# Altium footprint library d1_PcbLib.PcbLib: 266 footprints (part 5 of 17)
Each footprint in its own frame and in the unit in brackets; x right, y up, seen from the top. Pads: shape width x height; smd on the part's side, far side on the other; paste and mask are expansions set on the pad; w line width, h text height; cw(c..) or ccw(c..) is an arc to the next point about the centre after c.
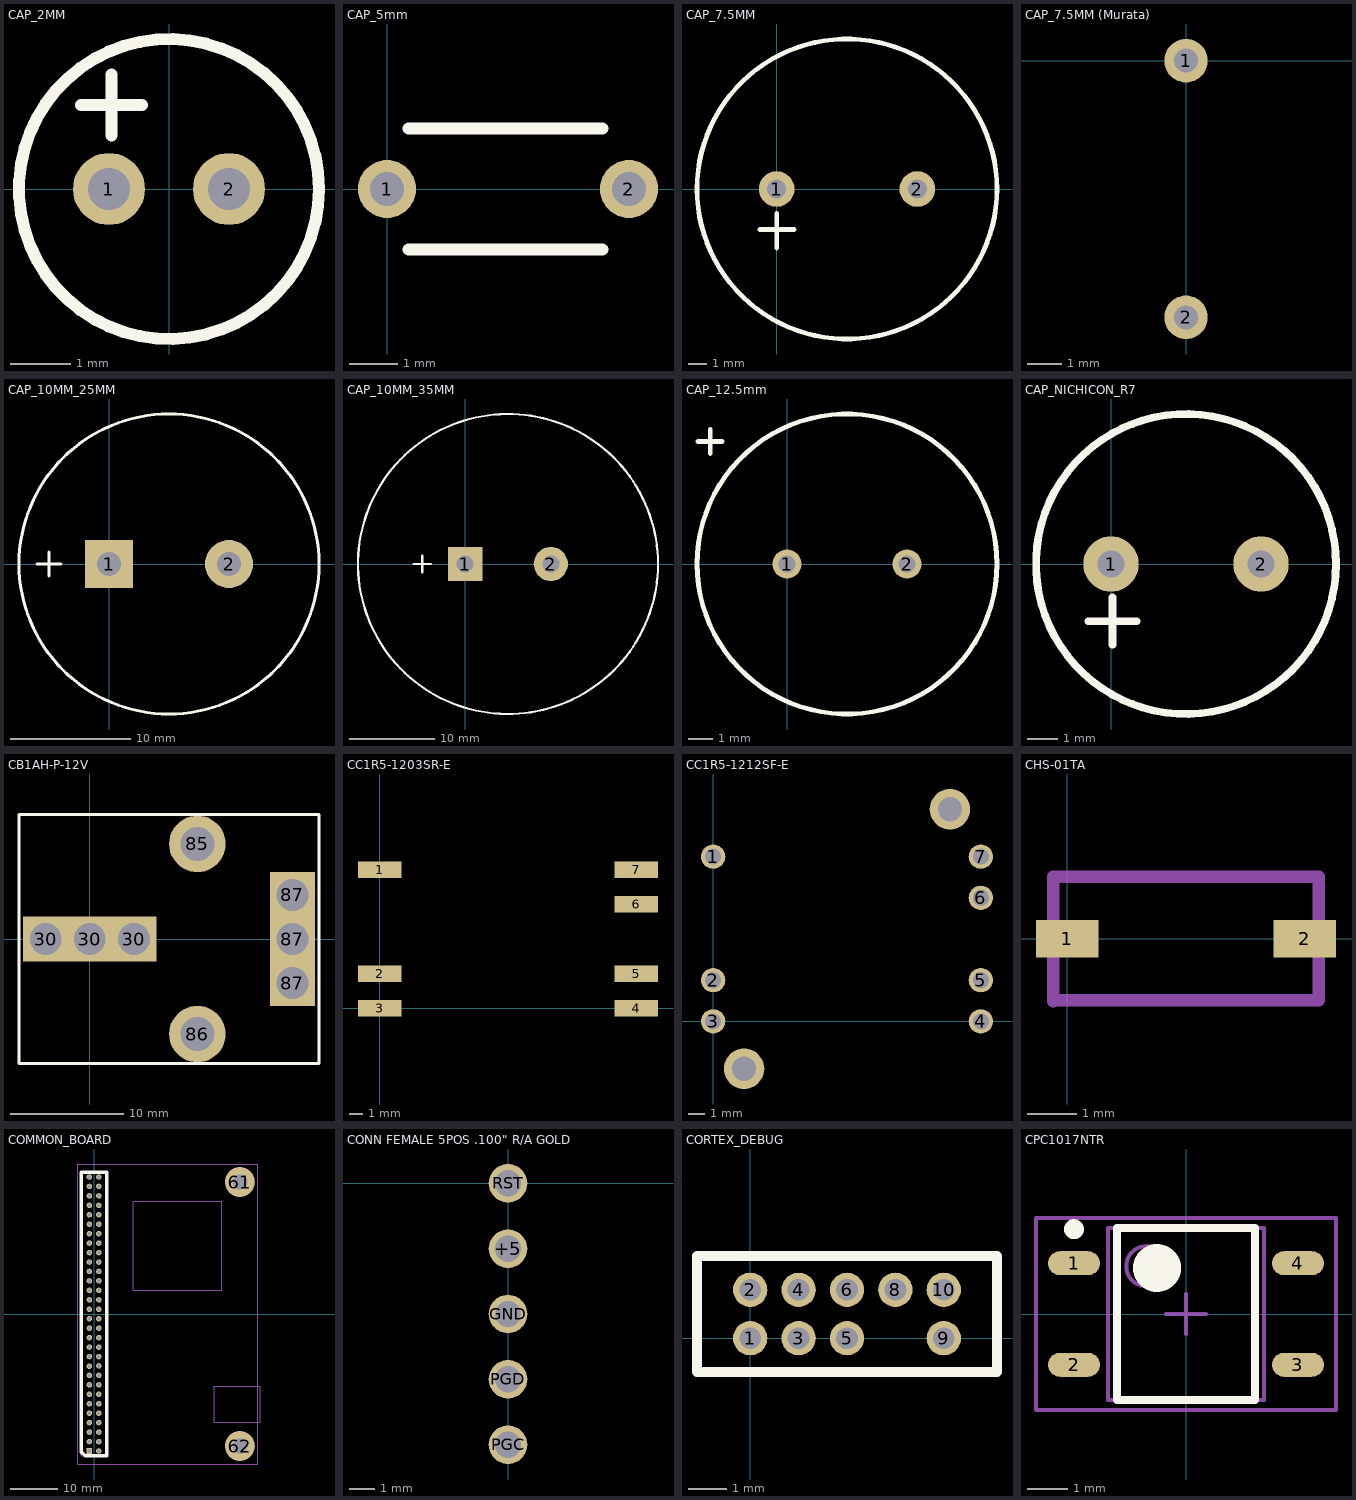
[diagram p4: the footprints below, top view; thin cyan lines are the x and y axes]

## CAP_2MM [mm]
pads (2):
  round 1.2 hole 0.7: 1(-1,0) 2(1,0)
Top Overlay:
  circle w0.2: c0,0 r2.5
  lines w0.2: -1.468,1.4 -0.452,1.4 ; -0.96,0.892 -0.96,1.908
3D body: height 11, standoff -19, extent -2.5,-2.5 2.5,2.5

## CAP_5mm [mm]
pads (2):
  round 1.2 hole 0.7: 1(0,0) 2(5,0)
Top Overlay:
  lines w0.254: 0.45,-1.25 4.45,-1.25 ; 0.45,1.25 4.45,1.25

## CAP_7.5MM [mil]
pads (2):
  round 75 hole 40: 1(0,0) 2(295.28,0)
Top Overlay:
  circle w10: c147.64,0 r314.96
  lines w10: -35,-85 37,-85 ; 0,-124 0,-51

## CAP_7.5MM (Murata) [mm]
pads (2):
  round 1.27 hole 0.7: 1(0,0) 2(0,-7.5)

## CAP_10MM_25MM [mm]
pads (2):
  rect 4x4 hole 2: 1(0,0)
  round 4 hole 2: 2(10,0)
Top Overlay:
  circle w0.254: c5,0 r12.5
  lines w0.254: -6,0 -4,0 ; -5,-1 -5,1
3D body: height 25, standoff 0, extent -7.39,-12.669 17.511,12.282

## CAP_10MM_35MM [mm]
pads (2):
  rect 4x4 hole 2: 1(0,0)
  round 4 hole 2: 2(10,0)
Top Overlay:
  circle w0.254: c5,0 r17.5
  lines w0.254: -6,0 -4,0 ; -5,-1 -5,1
3D body: height 25, standoff 0, extent -12.351,-17.659 22.511,17.272

## CAP_12.5mm [mm]
pads (2):
  round 1.2 hole 0.7: 1(0,0) 2(5,0)
Top Overlay:
  circle w0.2: c2.5,0 r6.25
  lines w0.2: -3.718,5.1 -2.702,5.1 ; -3.2,4.6 -3.2,5.616

## CAP_NICHICON_R7 [mm]
pads (2):
  round 1.85 hole 0.9: 1(0,0) 2(5,0)
Top Overlay:
  circle w0.254: c2.5,0 r5
  lines w0.254: -0.762,-1.905 0.864,-1.905 ; 0.051,-2.692 0.051,-1.118
3D body: height 12.5, standoff 0, extent -2.464,-4.953 7.544,5.055

## CB1AH-P-12V [mm] "RELAY AUTO SPST 12VDC 70A PCB"
pads (8):
  rect 4x4 hole 2.81: 30(-3.9,0) 30(0,0) 30(3.9,0) 87(17.9,-3.9) 87(17.9,0) 87(17.9,3.9)
  round 5 hole 3: 85(9.5,8.4) 86(9.5,-8.4)
Top Overlay:
  lines w0.254: -6.258,-11 -6.258,11 20.242,11 20.242,-11 -6.258,-11

## CC1R5-1203SR-E [mm]
pads (7):
  rect 3.2x1.2 smd: 1(0,10.16) 2(0,2.54) 3(0,0) 4(18.8,0) 5(18.8,2.54) 6(18.8,7.62) 7(18.8,10.16)

## CC1R5-1212SF-E [mm]
height 34
pads (9):
  round 1.5 hole 1: 1(0,10.16) 2(0,2.54) 3(0,0) 4(16.51,0) 5(16.51,2.54) 6(16.51,7.62) 7(16.51,10.16)
  round 2.5 hole 1.5: ""(1.905,-2.92) ""(14.605,13.08)

## CHS-01TA [mil]
pads (2):
  rect 50x30 smd: 1(0,0) 2(190,0)
Mechanical 13:
  lines w10: -11.3,-50 -11.3,49.21 201.3,49.21 201.3,-49.21 -10.51,-49.21 -11.3,-50
3D body: height 98.43, standoff 0, extent -11.32,-50.02 201.32,49.23

## COMMON_BOARD [mil]
pads (62):
  rect 46x46 hole 31: 1(-38.74,-1141.73)
  round 46 hole 31: 2(40,-1141.73) 3(-38.74,-1062.99) 4(40,-1062.99) 5(-38.74,-984.25) 6(40,-984.25) 7(-38.74,-905.51) 8(40,-905.51) 9(-38.74,-826.77) 10(40,-826.77) 11(-38.74,-748.03) 12(40,-748.03) 13(-38.74,-669.29) 14(40,-669.29) 15(-38.74,-590.55) 16(40,-590.55) 17(-38.74,-511.81) 18(40,-511.81) 19(-39.37,-435) 20(40,-433.07) 21(-38.74,-354.33) 22(40,-354.33) 23(-38.74,-275.59) 24(40,-275.59) 25(-38.74,-196.85) 26(40,-196.85) 27(-38.74,-118.11) 28(40,-118.11) 29(-38.74,-39.37) 30(40,-39.37) 31(-38.74,39.37) 32(40,39.37) 33(-38.74,118.11) 34(40,118.11) 35(-38.74,196.85) 36(40,196.85) 37(-38.74,275.59) 38(40,275.59) 39(-38.74,354.33) 40(40,354.33) 41(-38.74,433.07) 42(40,433.07) 43(-38.74,511.81) 44(40,511.81) 45(-38.74,590.55) 46(40,590.55) 47(-38.74,669.29) 48(40,669.29) 49(-38.74,748.03) 50(40,748.03) 51(-38.74,826.77) 52(40,826.77) 53(-38.74,905.51) 54(40,905.51) 55(-38.74,984.25) 56(40,984.25) 57(-38.74,1062.99) 58(40,1062.99) 59(-38.74,1141.73) 60(40,1141.73)
  round 250 hole 125: 61(1215,1100) 62(1215,-1100)
Top Overlay:
  lines w29.53: -105,-1150 -73.9,-1181.1 105,-1181.1 105,1181.1 -105,1181.1 -105,-1150
Mechanical 13:
  circle w10: c1215,1100 r100
  circle w10: c1215,-1100 r100
  lines w10: -135,-1250 1365,-1250 1365,1250 -135,1250 -135,-1250 ; -105,-1181.1 -105,1181.1 105,1181.1 105,-1181.1 -105,-1181.1 ; 325,200 1065,200 1065,940 325,940 325,200 ; 1000,-900 1385,-900 1385,-600 1000,-600 1000,-900
3D body: height 856.5, standoff 0.1, extent -135,-1250 1384.98,1250
3D body: height 375, standoff 0, extent 1114.54,999.54 1315.46,1200.46
3D body: height 375, standoff 0, extent 1114.54,-1200.46 1315.46,-999.54

## CONN FEMALE 5POS .100" R/A GOLD [mm] "PICKIT2 Programmer Header"
height 8.5
pads (5):
  round 1.5 hole 1.02: +5(0,-2.54) GND(0,-5.08) PGC(0,-10.16) PGD(0,-7.62) RST(0,0)
3D body: height 2.54, standoff 0, extent 1.6,-11.7 10.1,1.5

## CORTEX_DEBUG [mm]
pads (9):
  round 0.9 hole 0.574: 1(0,0) 2(0,1.27) 3(1.27,0) 4(1.27,1.27) 5(2.54,0) 6(2.54,1.27) 8(3.81,1.27) 9(5.08,0) 10(5.08,1.27)
Top Overlay:
  lines w0.254: -1.397,-0.889 -1.397,2.159 6.477,2.159 6.477,-0.889 -1.397,-0.889
3D body: height 5.85, standoff -2.15, extent -0.686,-1.549 5.664,2.896

## CPC1017NTR [mm] "SOP, 4-Leads, Body 4.3x3.9mm (max), Pitch 2.54mm, IPC Medium Density"
height 2.184
pads (4):
  oval 1.3x0.6 smd: 1(-2.8,1.27) 2(-2.8,-1.27) 3(2.8,-1.27) 4(2.8,1.27)
Top Overlay:
  circle w0.25: c-2.8,2.12 r0.125
  circle w0.6: c-0.725,1.15 r0.3
  lines w0.2: -1.725,-2.15 -1.725,2.15 1.725,2.15 1.725,-2.15 -1.725,-2.15
Mechanical 13:
  circle w0.1: c-0.995,1.195 r0.5
  lines w0.1: -1.945,-2.145 -1.945,2.145 1.945,2.145 1.945,-2.145 -1.945,-2.145
Mechanical 15:
  lines w0.1: -0.5,0 0.5,0 ; 0,-0.5 0,0.5 ; -3.75,-2.4 -3.75,2.4 3.75,2.4 3.75,-2.4 -3.75,-2.4
3D body: height 2.18, standoff 0.03, extent -1.945,-2.145 1.945,2.145